# Altium schematic symbol library jlcpcb_2025_04_capacitors_extended_0603.schlib: 3668 symbols (part 7 of 20)
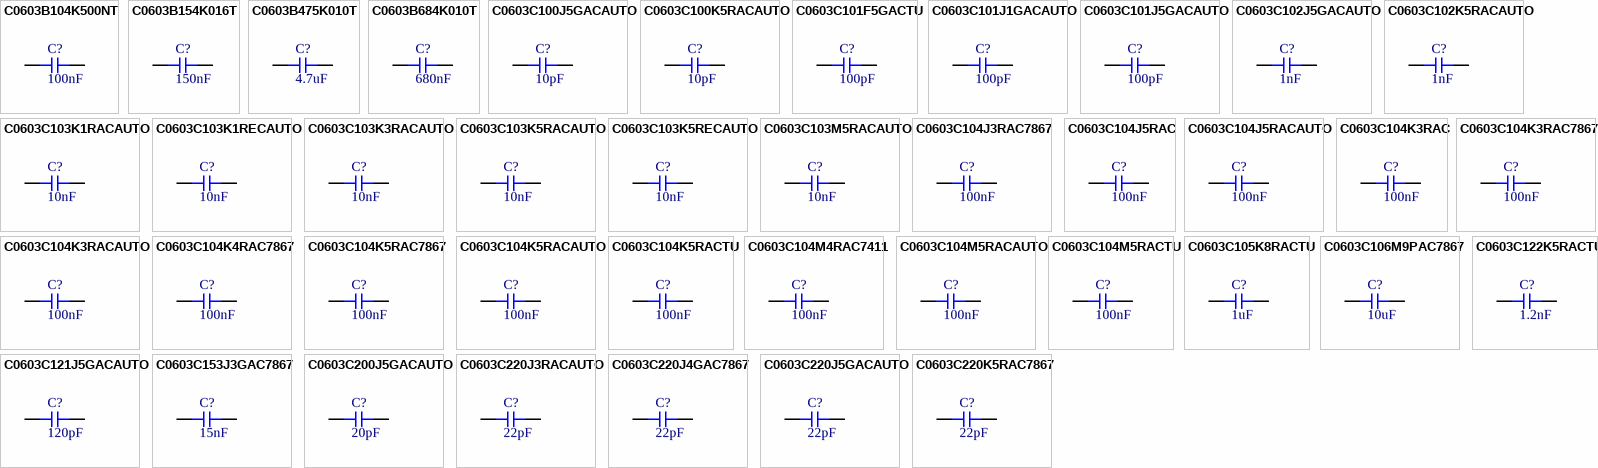
[diagram p97: symbols C0603B104K500NT to C0603C220K5RAC7867]

## C0603C104K3RAC7867
designator C?  Capacitance: 100nF  (hidden comment: *)
Capacitor, Ceramic (MLCC), 100nF, ±10%, 25V, X7R, ±10%, SMD 0603; Manufacturer: KEMET; Manufacturer Part Number: C0603C104K3RAC7867; Package Size: 0603; JLCPCB Basic Part: No; JLCPCB Part Number: C561807; Supplier 1: LCSC; Category: Capacitors - MLCC; Supplier Part Number 1: C561807; Tolerance: ±10%; Voltage Rating: 25V; Temperature Coefficient: X7R; RoHS: Yes; ComponentLink1Description: Datasheet; ComponentLink1URL: https://wmsc.lcsc.com/wmsc/upload/file/pdf/v2/lcsc/2304140030_KEMET-C0603C104K3RAC7867_C561807.pdf; ComponentLink2Description: JLCPCB Part URL; ComponentLink2URL: https://jlcpcb.com/partdetail/C561807; ComponentLink3Description: LCSC Part URL; ComponentLink3URL: https://lcsc.com/product-detail/Multilayer-Ceramic-Capacitors-MLCC---SMD-SMT_KEMET-KEMET-C0603C104K3RAC7867_C561807.html
footprint CAP-0603 (0603 (1608M) Capacitor)
pins: 1, 2

## C0603C104K3RACAUTO
designator C?  Capacitance: 100nF  (hidden comment: *)
Capacitor, Ceramic (MLCC), 100nF, ±10%, 25V, X7R, ±10%, SMD 0603; Manufacturer: KEMET; Manufacturer Part Number: C0603C104K3RACAUTO; Package Size: 0603; JLCPCB Basic Part: No; JLCPCB Part Number: C172738; Supplier 1: LCSC; Category: Capacitors - MLCC; Supplier Part Number 1: C172738; Tolerance: ±10%; Voltage Rating: 25V; Temperature Coefficient: X7R; RoHS: Yes; ComponentLink1Description: Datasheet; ComponentLink1URL: https://wmsc.lcsc.com/wmsc/upload/file/pdf/v2/lcsc/1809291526_KEMET-C0603C104K3RACAUTO_C172738.pdf; ComponentLink2Description: JLCPCB Part URL; ComponentLink2URL: https://jlcpcb.com/partdetail/C172738; ComponentLink3Description: LCSC Part URL; ComponentLink3URL: https://lcsc.com/product-detail/Multilayer-Ceramic-Capacitors-MLCC---SMD-SMT_KEMET-KEMET-C0603C104K3RACAUTO_C172738.html
footprint CAP-0603 (0603 (1608M) Capacitor)
pins: 1, 2

## C0603C104K4RAC7867
designator C?  Capacitance: 100nF  (hidden comment: *)
Capacitor, Ceramic (MLCC), 100nF, ±10%, 16V, X7R, ±10%, SMD 0603; Manufacturer: KEMET; Manufacturer Part Number: C0603C104K4RAC7867; Package Size: 0603; JLCPCB Basic Part: No; JLCPCB Part Number: C141082; Supplier 1: LCSC; Category: Capacitors - MLCC; Supplier Part Number 1: C141082; Tolerance: ±10%; Voltage Rating: 16V; Temperature Coefficient: X7R; RoHS: Yes; ComponentLink1Description: Datasheet; ComponentLink1URL: https://wmsc.lcsc.com/wmsc/upload/file/pdf/v2/lcsc/2304140030_KEMET-C0603C104K4RAC7867_C141082.pdf; ComponentLink2Description: JLCPCB Part URL; ComponentLink2URL: https://jlcpcb.com/partdetail/C141082; ComponentLink3Description: LCSC Part URL; ComponentLink3URL: https://lcsc.com/product-detail/Multilayer-Ceramic-Capacitors-MLCC---SMD-SMT_KEMET-KEMET-C0603C104K4RAC7867_C141082.html
footprint CAP-0603 (0603 (1608M) Capacitor)
pins: 1, 2

## C0603C104K5RAC7867
designator C?  Capacitance: 100nF  (hidden comment: *)
Capacitor, Ceramic (MLCC), 100nF, ±10%, 50V, X7R, ±10%, SMD 0603; Manufacturer: KEMET; Manufacturer Part Number: C0603C104K5RAC7867; Package Size: 0603; JLCPCB Basic Part: No; JLCPCB Part Number: C141084; Supplier 1: LCSC; Category: Capacitors - MLCC; Supplier Part Number 1: C141084; Tolerance: ±10%; Voltage Rating: 50V; Temperature Coefficient: X7R; RoHS: Yes; ComponentLink1Description: Datasheet; ComponentLink1URL: https://wmsc.lcsc.com/wmsc/upload/file/pdf/v2/lcsc/2304140030_KEMET-C0603C104K5RAC7867_C141084.pdf; ComponentLink2Description: JLCPCB Part URL; ComponentLink2URL: https://jlcpcb.com/partdetail/C141084; ComponentLink3Description: LCSC Part URL; ComponentLink3URL: https://lcsc.com/product-detail/Multilayer-Ceramic-Capacitors-MLCC---SMD-SMT_KEMET-KEMET-C0603C104K5RAC7867_C141084.html
footprint CAP-0603 (0603 (1608M) Capacitor)
pins: 1, 2

## C0603C104K5RACAUTO
designator C?  Capacitance: 100nF  (hidden comment: *)
Capacitor, Ceramic (MLCC), 100nF, ±10%, 50V, X7R, ±10%, SMD 0603; Manufacturer: KEMET; Manufacturer Part Number: C0603C104K5RACAUTO; Package Size: 0603; JLCPCB Basic Part: No; JLCPCB Part Number: C129621; Supplier 1: LCSC; Category: Capacitors - MLCC; Supplier Part Number 1: C129621; Tolerance: ±10%; Voltage Rating: 50V; Temperature Coefficient: X7R; RoHS: Yes; ComponentLink1Description: Datasheet; ComponentLink1URL: https://wmsc.lcsc.com/wmsc/upload/file/pdf/v2/lcsc/2304140030_KEMET-C0603C104K5RACAUTO_C129621.pdf; ComponentLink2Description: JLCPCB Part URL; ComponentLink2URL: https://jlcpcb.com/partdetail/C129621; ComponentLink3Description: LCSC Part URL; ComponentLink3URL: https://lcsc.com/product-detail/Multilayer-Ceramic-Capacitors-MLCC---SMD-SMT_KEMET-KEMET-C0603C104K5RACAUTO_C129621.html
footprint CAP-0603 (0603 (1608M) Capacitor)
pins: 1, 2

## C0603C104K5RACTU
designator C?  Capacitance: 100nF  (hidden comment: *)
Capacitor, Ceramic (MLCC), 100nF, ±10%, 50V, X7R, ±10%, SMD 0603; Manufacturer: KEMET; Manufacturer Part Number: C0603C104K5RACTU; Package Size: 0603; JLCPCB Basic Part: No; JLCPCB Part Number: C127833; Supplier 1: LCSC; Category: Capacitors - MLCC; Supplier Part Number 1: C127833; Tolerance: ±10%; Voltage Rating: 50V; Temperature Coefficient: X7R; RoHS: Yes; ComponentLink1Description: Datasheet; ComponentLink1URL: https://wmsc.lcsc.com/wmsc/upload/file/pdf/v2/lcsc/2304140030_KEMET-C0603C104K5RACTU_C127833.pdf; ComponentLink2Description: JLCPCB Part URL; ComponentLink2URL: https://jlcpcb.com/partdetail/C127833; ComponentLink3Description: LCSC Part URL; ComponentLink3URL: https://lcsc.com/product-detail/Multilayer-Ceramic-Capacitors-MLCC---SMD-SMT_KEMET-KEMET-C0603C104K5RACTU_C127833.html
footprint CAP-0603 (0603 (1608M) Capacitor)
pins: 1, 2

## C0603C104M4RAC7411
designator C?  Capacitance: 100nF  (hidden comment: *)
Capacitor, Ceramic (MLCC), 100nF, ±20%, 16V, X7R, ±20%, SMD 0603; Manufacturer: KEMET; Manufacturer Part Number: C0603C104M4RAC7411; Package Size: 0603; JLCPCB Basic Part: No; JLCPCB Part Number: C696360; Supplier 1: LCSC; Category: Capacitors - MLCC; Supplier Part Number 1: C696360; Tolerance: ±20%; Voltage Rating: 16V; Temperature Coefficient: X7R; RoHS: Yes; ComponentLink1Description: Datasheet; ComponentLink1URL: https://wmsc.lcsc.com/wmsc/upload/file/pdf/v2/lcsc/2304140030_KEMET-C0603C104M4RAC7411_C696360.pdf; ComponentLink2Description: JLCPCB Part URL; ComponentLink2URL: https://jlcpcb.com/partdetail/C696360; ComponentLink3Description: LCSC Part URL; ComponentLink3URL: https://lcsc.com/product-detail/Multilayer-Ceramic-Capacitors-MLCC---SMD-SMT_KEMET-KEMET-C0603C104M4RAC7411_C696360.html
footprint CAP-0603 (0603 (1608M) Capacitor)
pins: 1, 2

## C0603C104M5RACAUTO
designator C?  Capacitance: 100nF  (hidden comment: *)
Capacitor, Ceramic (MLCC), 100nF, ±20%, 50V, X7R, ±20%, SMD 0603; Manufacturer: KEMET; Manufacturer Part Number: C0603C104M5RACAUTO; Package Size: 0603; JLCPCB Basic Part: No; JLCPCB Part Number: C1845740; Supplier 1: LCSC; Category: Capacitors - MLCC; Supplier Part Number 1: C1845740; Tolerance: ±20%; Voltage Rating: 50V; Temperature Coefficient: X7R; RoHS: Yes; ComponentLink1Description: Datasheet; ComponentLink1URL: https://wmsc.lcsc.com/wmsc/upload/file/pdf/v2/lcsc/2304140030_KEMET-C0603C104M5RACAUTO_C1845740.pdf; ComponentLink2Description: JLCPCB Part URL; ComponentLink2URL: https://jlcpcb.com/partdetail/C1845740; ComponentLink3Description: LCSC Part URL; ComponentLink3URL: https://lcsc.com/product-detail/Multilayer-Ceramic-Capacitors-MLCC---SMD-SMT_KEMET-KEMET-C0603C104M5RACAUTO_C1845740.html
footprint CAP-0603 (0603 (1608M) Capacitor)
pins: 1, 2

## C0603C104M5RACTU
designator C?  Capacitance: 100nF  (hidden comment: *)
Capacitor, Ceramic (MLCC), 100nF, ±20%, 50V, X7R, ±20%, SMD 0603; Manufacturer: KEMET; Manufacturer Part Number: C0603C104M5RACTU; Package Size: 0603; JLCPCB Basic Part: No; JLCPCB Part Number: C2649536; Supplier 1: LCSC; Category: Capacitors - MLCC; Supplier Part Number 1: C2649536; Tolerance: ±20%; Voltage Rating: 50V; Temperature Coefficient: X7R; RoHS: Yes; ComponentLink1Description: Datasheet; ComponentLink1URL: https://wmsc.lcsc.com/wmsc/upload/file/pdf/v2/lcsc/2304140030_KEMET-C0603C104M5RACTU_C2649536.pdf; ComponentLink2Description: JLCPCB Part URL; ComponentLink2URL: https://jlcpcb.com/partdetail/C2649536; ComponentLink3Description: LCSC Part URL; ComponentLink3URL: https://lcsc.com/product-detail/Multilayer-Ceramic-Capacitors-MLCC---SMD-SMT_KEMET-KEMET-C0603C104M5RACTU_C2649536.html
footprint CAP-0603 (0603 (1608M) Capacitor)
pins: 1, 2

## C0603C105K8RACTU
designator C?  Capacitance: 1uF  (hidden comment: *)
Capacitor, Ceramic (MLCC), 1uF, ±10%, 10V, X7R, ±10%, SMD 0603; Manufacturer: KEMET; Manufacturer Part Number: C0603C105K8RACTU; Package Size: 0603; JLCPCB Basic Part: No; JLCPCB Part Number: C2168630; Supplier 1: LCSC; Category: Capacitors - MLCC; Supplier Part Number 1: C2168630; Tolerance: ±10%; Voltage Rating: 10V; Temperature Coefficient: X7R; RoHS: Yes; ComponentLink1Description: Datasheet; ComponentLink1URL: https://wmsc.lcsc.com/wmsc/upload/file/pdf/v2/lcsc/2304140030_KEMET-C0603C105K8RACTU_C2168630.pdf; ComponentLink2Description: JLCPCB Part URL; ComponentLink2URL: https://jlcpcb.com/partdetail/C2168630; ComponentLink3Description: LCSC Part URL; ComponentLink3URL: https://lcsc.com/product-detail/Multilayer-Ceramic-Capacitors-MLCC---SMD-SMT_KEMET-KEMET-C0603C105K8RACTU_C2168630.html
footprint CAP-0603 (0603 (1608M) Capacitor)
pins: 1, 2

## C0603C106M9PAC7867
designator C?  Capacitance: 10uF  (hidden comment: *)
Capacitor, Ceramic (MLCC), 10uF, ±20%, 6.3V, X5R, ±20%, SMD 0603; Manufacturer: KEMET; Manufacturer Part Number: C0603C106M9PAC7867; Package Size: 0603; JLCPCB Basic Part: No; JLCPCB Part Number: C599662; Supplier 1: LCSC; Category: Capacitors - MLCC; Supplier Part Number 1: C599662; Tolerance: ±20%; Voltage Rating: 6.3V; Temperature Coefficient: X5R; RoHS: Yes; ComponentLink1Description: Datasheet; ComponentLink1URL: https://wmsc.lcsc.com/wmsc/upload/file/pdf/v2/lcsc/2006181135_KEMET-C0603C106M9PAC7867_C599662.pdf; ComponentLink2Description: JLCPCB Part URL; ComponentLink2URL: https://jlcpcb.com/partdetail/C599662; ComponentLink3Description: LCSC Part URL; ComponentLink3URL: https://lcsc.com/product-detail/Multilayer-Ceramic-Capacitors-MLCC---SMD-SMT_KEMET-KEMET-C0603C106M9PAC7867_C599662.html
footprint CAP-0603 (0603 (1608M) Capacitor)
pins: 1, 2

## C0603C121J5GACAUTO
designator C?  Capacitance: 120pF  (hidden comment: *)
Capacitor, Ceramic (MLCC), 120pF, ±5%, 50V, C0G, ±5%, SMD 0603; Manufacturer: KEMET; Manufacturer Part Number: C0603C121J5GACAUTO; Package Size: 0603; JLCPCB Basic Part: No; JLCPCB Part Number: C599667; Supplier 1: LCSC; Category: Capacitors - MLCC; Supplier Part Number 1: C599667; Tolerance: ±5%; Voltage Rating: 50V; Temperature Coefficient: C0G; RoHS: Yes; ComponentLink1Description: Datasheet; ComponentLink1URL: https://wmsc.lcsc.com/wmsc/upload/file/pdf/v2/lcsc/2006181135_KEMET-C0603C121J5GACAUTO_C599667.pdf; ComponentLink2Description: JLCPCB Part URL; ComponentLink2URL: https://jlcpcb.com/partdetail/C599667; ComponentLink3Description: LCSC Part URL; ComponentLink3URL: https://lcsc.com/product-detail/Multilayer-Ceramic-Capacitors-MLCC---SMD-SMT_KEMET-KEMET-C0603C121J5GACAUTO_C599667.html
footprint CAP-0603 (0603 (1608M) Capacitor)
pins: 1, 2

## C0603C122K5RACTU
designator C?  Capacitance: 1.2nF  (hidden comment: *)
Capacitor, Ceramic (MLCC), 1.2nF, ±10%, 50V, X7R, ±10%, SMD 0603; Manufacturer: KEMET; Manufacturer Part Number: C0603C122K5RACTU; Package Size: 0603; JLCPCB Basic Part: No; JLCPCB Part Number: C2168436; Supplier 1: LCSC; Category: Capacitors - MLCC; Supplier Part Number 1: C2168436; Tolerance: ±10%; Voltage Rating: 50V; Temperature Coefficient: X7R; RoHS: Yes; ComponentLink1Description: Datasheet; ComponentLink1URL: https://wmsc.lcsc.com/wmsc/upload/file/pdf/v2/lcsc/2304140030_KEMET-C0603C122K5RACTU_C2168436.pdf; ComponentLink2Description: JLCPCB Part URL; ComponentLink2URL: https://jlcpcb.com/partdetail/C2168436; ComponentLink3Description: LCSC Part URL; ComponentLink3URL: https://lcsc.com/product-detail/Multilayer-Ceramic-Capacitors-MLCC---SMD-SMT_KEMET-KEMET-C0603C122K5RACTU_C2168436.html
footprint CAP-0603 (0603 (1608M) Capacitor)
pins: 1, 2

## C0603C153J3GAC7867
designator C?  Capacitance: 15nF  (hidden comment: *)
Capacitor, Ceramic (MLCC), 15nF, ±5%, 25V, C0G, ±5%, SMD 0603; Manufacturer: KEMET; Manufacturer Part Number: C0603C153J3GAC7867; Package Size: 0603; JLCPCB Basic Part: No; JLCPCB Part Number: C696363; Supplier 1: LCSC; Category: Capacitors - MLCC; Supplier Part Number 1: C696363; Tolerance: ±5%; Voltage Rating: 25V; Temperature Coefficient: C0G; RoHS: Yes; ComponentLink1Description: Datasheet; ComponentLink1URL: https://wmsc.lcsc.com/wmsc/upload/file/pdf/v2/lcsc/2304140030_KEMET-C0603C153J3GAC7867_C696363.pdf; ComponentLink2Description: JLCPCB Part URL; ComponentLink2URL: https://jlcpcb.com/partdetail/C696363; ComponentLink3Description: LCSC Part URL; ComponentLink3URL: https://lcsc.com/product-detail/Multilayer-Ceramic-Capacitors-MLCC---SMD-SMT_KEMET-KEMET-C0603C153J3GAC7867_C696363.html
footprint CAP-0603 (0603 (1608M) Capacitor)
pins: 1, 2

## C0603C200J5GACAUTO
designator C?  Capacitance: 20pF  (hidden comment: *)
Capacitor, Ceramic (MLCC), 20pF, ±5%, 50V, C0G, ±5%, SMD 0603; Manufacturer: KEMET; Manufacturer Part Number: C0603C200J5GACAUTO; Package Size: 0603; JLCPCB Basic Part: No; JLCPCB Part Number: C129624; Supplier 1: LCSC; Category: Capacitors - MLCC; Supplier Part Number 1: C129624; Tolerance: ±5%; Voltage Rating: 50V; Temperature Coefficient: C0G; RoHS: Yes; ComponentLink1Description: Datasheet; ComponentLink1URL: https://wmsc.lcsc.com/wmsc/upload/file/pdf/v2/lcsc/2304140030_KEMET-C0603C200J5GACAUTO_C129624.pdf; ComponentLink2Description: JLCPCB Part URL; ComponentLink2URL: https://jlcpcb.com/partdetail/C129624; ComponentLink3Description: LCSC Part URL; ComponentLink3URL: https://lcsc.com/product-detail/Multilayer-Ceramic-Capacitors-MLCC---SMD-SMT_KEMET-KEMET-C0603C200J5GACAUTO_C129624.html
footprint CAP-0603 (0603 (1608M) Capacitor)
pins: 1, 2

## C0603C220J3RACAUTO
designator C?  Capacitance: 22pF  (hidden comment: *)
Capacitor, Ceramic (MLCC), 22pF, ±5%, 25V, X7R, ±5%, SMD 0603; Manufacturer: KEMET; Manufacturer Part Number: C0603C220J3RACAUTO; Package Size: 0603; JLCPCB Basic Part: No; JLCPCB Part Number: C129626; Supplier 1: LCSC; Category: Capacitors - MLCC; Supplier Part Number 1: C129626; Tolerance: ±5%; Voltage Rating: 25V; Temperature Coefficient: X7R; RoHS: Yes; ComponentLink1Description: Datasheet; ComponentLink1URL: https://wmsc.lcsc.com/wmsc/upload/file/pdf/v2/lcsc/2304140030_KEMET-C0603C220J3RACAUTO_C129626.pdf; ComponentLink2Description: JLCPCB Part URL; ComponentLink2URL: https://jlcpcb.com/partdetail/C129626; ComponentLink3Description: LCSC Part URL; ComponentLink3URL: https://lcsc.com/product-detail/Multilayer-Ceramic-Capacitors-MLCC---SMD-SMT_KEMET-KEMET-C0603C220J3RACAUTO_C129626.html
footprint CAP-0603 (0603 (1608M) Capacitor)
pins: 1, 2

## C0603C220J4GAC7867
designator C?  Capacitance: 22pF  (hidden comment: *)
Capacitor, Ceramic (MLCC), 22pF, ±5%, 16V, C0G, ±5%, SMD 0603; Manufacturer: KEMET; Manufacturer Part Number: C0603C220J4GAC7867; Package Size: 0603; JLCPCB Basic Part: No; JLCPCB Part Number: C561800; Supplier 1: LCSC; Category: Capacitors - MLCC; Supplier Part Number 1: C561800; Tolerance: ±5%; Voltage Rating: 16V; Temperature Coefficient: C0G; RoHS: Yes; ComponentLink1Description: Datasheet; ComponentLink1URL: https://wmsc.lcsc.com/wmsc/upload/file/pdf/v2/lcsc/2006181109_KEMET-C0603C220J4GAC7867_C561800.pdf; ComponentLink2Description: JLCPCB Part URL; ComponentLink2URL: https://jlcpcb.com/partdetail/C561800; ComponentLink3Description: LCSC Part URL; ComponentLink3URL: https://lcsc.com/product-detail/Multilayer-Ceramic-Capacitors-MLCC---SMD-SMT_KEMET-KEMET-C0603C220J4GAC7867_C561800.html
footprint CAP-0603 (0603 (1608M) Capacitor)
pins: 1, 2

## C0603C220J5GACAUTO
designator C?  Capacitance: 22pF  (hidden comment: *)
Capacitor, Ceramic (MLCC), 22pF, ±5%, 50V, C0G, ±5%, SMD 0603; Manufacturer: KEMET; Manufacturer Part Number: C0603C220J5GACAUTO; Package Size: 0603; JLCPCB Basic Part: No; JLCPCB Part Number: C599692; Supplier 1: LCSC; Category: Capacitors - MLCC; Supplier Part Number 1: C599692; Tolerance: ±5%; Voltage Rating: 50V; Temperature Coefficient: C0G; RoHS: Yes; ComponentLink1Description: Datasheet; ComponentLink1URL: https://wmsc.lcsc.com/wmsc/upload/file/pdf/v2/lcsc/2006181136_KEMET-C0603C220J5GACAUTO_C599692.pdf; ComponentLink2Description: JLCPCB Part URL; ComponentLink2URL: https://jlcpcb.com/partdetail/C599692; ComponentLink3Description: LCSC Part URL; ComponentLink3URL: https://lcsc.com/product-detail/Multilayer-Ceramic-Capacitors-MLCC---SMD-SMT_KEMET-KEMET-C0603C220J5GACAUTO_C599692.html
footprint CAP-0603 (0603 (1608M) Capacitor)
pins: 1, 2

## C0603C220K5RAC7867
designator C?  Capacitance: 22pF  (hidden comment: *)
Capacitor, Ceramic (MLCC), 22pF, ±10%, 50V, X7R, ±10%, SMD 0603; Manufacturer: KEMET; Manufacturer Part Number: C0603C220K5RAC7867; Package Size: 0603; JLCPCB Basic Part: No; JLCPCB Part Number: C561821; Supplier 1: LCSC; Category: Capacitors - MLCC; Supplier Part Number 1: C561821; Tolerance: ±10%; Voltage Rating: 50V; Temperature Coefficient: X7R; RoHS: Yes; ComponentLink1Description: Datasheet; ComponentLink1URL: https://wmsc.lcsc.com/wmsc/upload/file/pdf/v2/lcsc/2304140030_KEMET-C0603C220K5RAC7867_C561821.pdf; ComponentLink2Description: JLCPCB Part URL; ComponentLink2URL: https://jlcpcb.com/partdetail/C561821; ComponentLink3Description: LCSC Part URL; ComponentLink3URL: https://lcsc.com/product-detail/Multilayer-Ceramic-Capacitors-MLCC---SMD-SMT_KEMET-KEMET-C0603C220K5RAC7867_C561821.html
footprint CAP-0603 (0603 (1608M) Capacitor)
pins: 1, 2

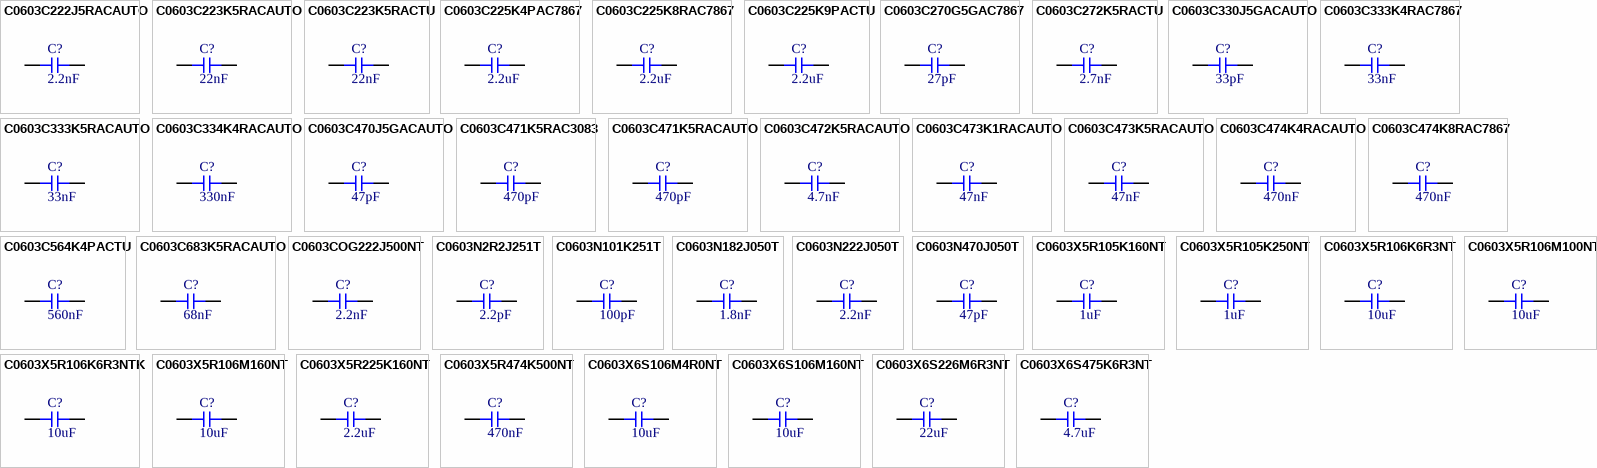
[diagram p28: symbols C0603C222J5RACAUTO to C0603X6S475K6R3NT]

## C0603C222J5RACAUTO
designator C?  Capacitance: 2.2nF  (hidden comment: *)
Capacitor, Ceramic (MLCC), 2.2nF, ±5%, 50V, X7R, ±5%, SMD 0603; Manufacturer: KEMET; Manufacturer Part Number: C0603C222J5RACAUTO; Package Size: 0603; JLCPCB Basic Part: No; JLCPCB Part Number: C599701; Supplier 1: LCSC; Category: Capacitors - MLCC; Supplier Part Number 1: C599701; Tolerance: ±5%; Voltage Rating: 50V; Temperature Coefficient: X7R; RoHS: Yes; ComponentLink1Description: Datasheet; ComponentLink1URL: https://wmsc.lcsc.com/wmsc/upload/file/pdf/v2/lcsc/2304140030_KEMET-C0603C222J5RACAUTO_C599701.pdf; ComponentLink2Description: JLCPCB Part URL; ComponentLink2URL: https://jlcpcb.com/partdetail/C599701; ComponentLink3Description: LCSC Part URL; ComponentLink3URL: https://lcsc.com/product-detail/Multilayer-Ceramic-Capacitors-MLCC---SMD-SMT_KEMET-KEMET-C0603C222J5RACAUTO_C599701.html
footprint CAP-0603 (0603 (1608M) Capacitor)
pins: 1, 2

## C0603C223K5RACAUTO
designator C?  Capacitance: 22nF  (hidden comment: *)
Capacitor, Ceramic (MLCC), 22nF, ±10%, 50V, X7R, ±10%, SMD 0603; Manufacturer: KEMET; Manufacturer Part Number: C0603C223K5RACAUTO; Package Size: 0603; JLCPCB Basic Part: No; JLCPCB Part Number: C561824; Supplier 1: LCSC; Category: Capacitors - MLCC; Supplier Part Number 1: C561824; Tolerance: ±10%; Voltage Rating: 50V; Temperature Coefficient: X7R; RoHS: Yes; ComponentLink1Description: Datasheet; ComponentLink1URL: https://wmsc.lcsc.com/wmsc/upload/file/pdf/v2/lcsc/2304140030_KEMET-C0603C223K5RACAUTO_C561824.pdf; ComponentLink2Description: JLCPCB Part URL; ComponentLink2URL: https://jlcpcb.com/partdetail/C561824; ComponentLink3Description: LCSC Part URL; ComponentLink3URL: https://lcsc.com/product-detail/Multilayer-Ceramic-Capacitors-MLCC---SMD-SMT_KEMET-KEMET-C0603C223K5RACAUTO_C561824.html
footprint CAP-0603 (0603 (1608M) Capacitor)
pins: 1, 2

## C0603C223K5RACTU
designator C?  Capacitance: 22nF  (hidden comment: *)
Capacitor, Ceramic (MLCC), 22nF, ±10%, 50V, X7R, ±10%, SMD 0603; Manufacturer: KEMET; Manufacturer Part Number: C0603C223K5RACTU; Package Size: 0603; JLCPCB Basic Part: No; JLCPCB Part Number: C2167136; Supplier 1: LCSC; Category: Capacitors - MLCC; Supplier Part Number 1: C2167136; Tolerance: ±10%; Voltage Rating: 50V; Temperature Coefficient: X7R; RoHS: Yes; ComponentLink1Description: Datasheet; ComponentLink1URL: https://wmsc.lcsc.com/wmsc/upload/file/pdf/v2/lcsc/2304140030_KEMET-C0603C223K5RACTU_C2167136.pdf; ComponentLink2Description: JLCPCB Part URL; ComponentLink2URL: https://jlcpcb.com/partdetail/C2167136; ComponentLink3Description: LCSC Part URL; ComponentLink3URL: https://lcsc.com/product-detail/Multilayer-Ceramic-Capacitors-MLCC---SMD-SMT_KEMET-KEMET-C0603C223K5RACTU_C2167136.html
footprint CAP-0603 (0603 (1608M) Capacitor)
pins: 1, 2

## C0603C225K4PAC7867
designator C?  Capacitance: 2.2uF  (hidden comment: *)
Capacitor, Ceramic (MLCC), 2.2uF, ±10%, 16V, X5R, ±10%, SMD 0603; Manufacturer: KEMET; Manufacturer Part Number: C0603C225K4PAC7867; Package Size: 0603; JLCPCB Basic Part: No; JLCPCB Part Number: C452748; Supplier 1: LCSC; Category: Capacitors - MLCC; Supplier Part Number 1: C452748; Tolerance: ±10%; Voltage Rating: 16V; Temperature Coefficient: X5R; RoHS: Yes; ComponentLink1Description: Datasheet; ComponentLink1URL: https://wmsc.lcsc.com/wmsc/upload/file/pdf/v2/lcsc/2304140030_KEMET-C0603C225K4PAC7867_C452748.pdf; ComponentLink2Description: JLCPCB Part URL; ComponentLink2URL: https://jlcpcb.com/partdetail/C452748; ComponentLink3Description: LCSC Part URL; ComponentLink3URL: https://lcsc.com/product-detail/Multilayer-Ceramic-Capacitors-MLCC---SMD-SMT_KEMET-KEMET-C0603C225K4PAC7867_C452748.html
footprint CAP-0603 (0603 (1608M) Capacitor)
pins: 1, 2

## C0603C225K8RAC7867
designator C?  Capacitance: 2.2uF  (hidden comment: *)
Capacitor, Ceramic (MLCC), 2.2uF, ±10%, 10V, X7R, ±10%, SMD 0603; Manufacturer: KEMET; Manufacturer Part Number: C0603C225K8RAC7867; Package Size: 0603; JLCPCB Basic Part: No; JLCPCB Part Number: C599715; Supplier 1: LCSC; Category: Capacitors - MLCC; Supplier Part Number 1: C599715; Tolerance: ±10%; Voltage Rating: 10V; Temperature Coefficient: X7R; RoHS: Yes; ComponentLink1Description: Datasheet; ComponentLink1URL: https://wmsc.lcsc.com/wmsc/upload/file/pdf/v2/lcsc/2304140030_KEMET-C0603C225K8RAC7867_C599715.pdf; ComponentLink2Description: JLCPCB Part URL; ComponentLink2URL: https://jlcpcb.com/partdetail/C599715; ComponentLink3Description: LCSC Part URL; ComponentLink3URL: https://lcsc.com/product-detail/Multilayer-Ceramic-Capacitors-MLCC---SMD-SMT_KEMET-KEMET-C0603C225K8RAC7867_C599715.html
footprint CAP-0603 (0603 (1608M) Capacitor)
pins: 1, 2

## C0603C225K9PACTU
designator C?  Capacitance: 2.2uF  (hidden comment: *)
Capacitor, Ceramic (MLCC), 2.2uF, ±10%, 6.3V, X5R, ±10%, SMD 0603; Manufacturer: KEMET; Manufacturer Part Number: C0603C225K9PACTU; Package Size: 0603; JLCPCB Basic Part: No; JLCPCB Part Number: C452749; Supplier 1: LCSC; Category: Capacitors - MLCC; Supplier Part Number 1: C452749; Tolerance: ±10%; Voltage Rating: 6.3V; Temperature Coefficient: X5R; RoHS: Yes; ComponentLink1Description: Datasheet; ComponentLink1URL: https://wmsc.lcsc.com/wmsc/upload/file/pdf/v2/lcsc/2304140030_KEMET-C0603C225K9PACTU_C452749.pdf; ComponentLink2Description: JLCPCB Part URL; ComponentLink2URL: https://jlcpcb.com/partdetail/C452749; ComponentLink3Description: LCSC Part URL; ComponentLink3URL: https://lcsc.com/product-detail/Multilayer-Ceramic-Capacitors-MLCC---SMD-SMT_KEMET-KEMET-C0603C225K9PACTU_C452749.html
footprint CAP-0603 (0603 (1608M) Capacitor)
pins: 1, 2

## C0603C270G5GAC7867
designator C?  Capacitance: 27pF  (hidden comment: *)
Capacitor, Ceramic (MLCC), 27pF, ±2%, 50V, C0G, ±2%, SMD 0603; Manufacturer: KEMET; Manufacturer Part Number: C0603C270G5GAC7867; Package Size: 0603; JLCPCB Basic Part: No; JLCPCB Part Number: C140963; Supplier 1: LCSC; Category: Capacitors - MLCC; Supplier Part Number 1: C140963; Tolerance: ±2%; Voltage Rating: 50V; Temperature Coefficient: C0G; RoHS: Yes; ComponentLink1Description: Datasheet; ComponentLink1URL: https://wmsc.lcsc.com/wmsc/upload/file/pdf/v2/lcsc/2304140030_KEMET-C0603C270G5GAC7867_C140963.pdf; ComponentLink2Description: JLCPCB Part URL; ComponentLink2URL: https://jlcpcb.com/partdetail/C140963; ComponentLink3Description: LCSC Part URL; ComponentLink3URL: https://lcsc.com/product-detail/Multilayer-Ceramic-Capacitors-MLCC---SMD-SMT_KEMET-KEMET-C0603C270G5GAC7867_C140963.html
footprint CAP-0603 (0603 (1608M) Capacitor)
pins: 1, 2

## C0603C272K5RACTU
designator C?  Capacitance: 2.7nF  (hidden comment: *)
Capacitor, Ceramic (MLCC), 2.7nF, ±10%, 50V, X7R, ±10%, SMD 0603; Manufacturer: KEMET; Manufacturer Part Number: C0603C272K5RACTU; Package Size: 0603; JLCPCB Basic Part: No; JLCPCB Part Number: C122709; Supplier 1: LCSC; Category: Capacitors - MLCC; Supplier Part Number 1: C122709; Tolerance: ±10%; Voltage Rating: 50V; Temperature Coefficient: X7R; RoHS: Yes; ComponentLink1Description: Datasheet; ComponentLink2Description: JLCPCB Part URL; ComponentLink2URL: https://jlcpcb.com/partdetail/C122709; ComponentLink3Description: LCSC Part URL; ComponentLink3URL: https://lcsc.com/product-detail/Multilayer-Ceramic-Capacitors-MLCC---SMD-SMT_KEMET-KEMET-C0603C272K5RACTU_C122709.html
footprint CAP-0603 (0603 (1608M) Capacitor)
pins: 1, 2

## C0603C330J5GACAUTO
designator C?  Capacitance: 33pF  (hidden comment: *)
Capacitor, Ceramic (MLCC), 33pF, ±5%, 50V, C0G, ±5%, SMD 0603; Manufacturer: KEMET; Manufacturer Part Number: C0603C330J5GACAUTO; Package Size: 0603; JLCPCB Basic Part: No; JLCPCB Part Number: C3888087; Supplier 1: LCSC; Category: Capacitors - MLCC; Supplier Part Number 1: C3888087; Tolerance: ±5%; Voltage Rating: 50V; Temperature Coefficient: C0G; RoHS: Yes; ComponentLink1Description: Datasheet; ComponentLink1URL: https://wmsc.lcsc.com/wmsc/upload/file/pdf/v2/lcsc/2401181722_KEMET-C0603C330J5GACAUTO_C3888087.pdf; ComponentLink2Description: JLCPCB Part URL; ComponentLink2URL: https://jlcpcb.com/partdetail/C3888087; ComponentLink3Description: LCSC Part URL; ComponentLink3URL: https://lcsc.com/product-detail/Multilayer-Ceramic-Capacitors-MLCC---SMD-SMT_KEMET-KEMET-C0603C330J5GACAUTO_C3888087.html
footprint CAP-0603 (0603 (1608M) Capacitor)
pins: 1, 2

## C0603C333K4RAC7867
designator C?  Capacitance: 33nF  (hidden comment: *)
Capacitor, Ceramic (MLCC), 33nF, ±10%, 16V, X7R, ±10%, SMD 0603; Manufacturer: KEMET; Manufacturer Part Number: C0603C333K4RAC7867; Package Size: 0603; JLCPCB Basic Part: No; JLCPCB Part Number: C599735; Supplier 1: LCSC; Category: Capacitors - MLCC; Supplier Part Number 1: C599735; Tolerance: ±10%; Voltage Rating: 16V; Temperature Coefficient: X7R; RoHS: Yes; ComponentLink1Description: Datasheet; ComponentLink1URL: https://wmsc.lcsc.com/wmsc/upload/file/pdf/v2/lcsc/2304140030_KEMET-C0603C333K4RAC7867_C599735.pdf; ComponentLink2Description: JLCPCB Part URL; ComponentLink2URL: https://jlcpcb.com/partdetail/C599735; ComponentLink3Description: LCSC Part URL; ComponentLink3URL: https://lcsc.com/product-detail/Multilayer-Ceramic-Capacitors-MLCC---SMD-SMT_KEMET-KEMET-C0603C333K4RAC7867_C599735.html
footprint CAP-0603 (0603 (1608M) Capacitor)
pins: 1, 2

## C0603C333K5RACAUTO
designator C?  Capacitance: 33nF  (hidden comment: *)
Capacitor, Ceramic (MLCC), 33nF, ±10%, 50V, X7R, ±10%, SMD 0603; Manufacturer: KEMET; Manufacturer Part Number: C0603C333K5RACAUTO; Package Size: 0603; JLCPCB Basic Part: No; JLCPCB Part Number: C141101; Supplier 1: LCSC; Category: Capacitors - MLCC; Supplier Part Number 1: C141101; Tolerance: ±10%; Voltage Rating: 50V; Temperature Coefficient: X7R; RoHS: Yes; ComponentLink1Description: Datasheet; ComponentLink1URL: https://wmsc.lcsc.com/wmsc/upload/file/pdf/v2/lcsc/2304140030_KEMET-C0603C333K5RACAUTO_C141101.pdf; ComponentLink2Description: JLCPCB Part URL; ComponentLink2URL: https://jlcpcb.com/partdetail/C141101; ComponentLink3Description: LCSC Part URL; ComponentLink3URL: https://lcsc.com/product-detail/Multilayer-Ceramic-Capacitors-MLCC---SMD-SMT_KEMET-KEMET-C0603C333K5RACAUTO_C141101.html
footprint CAP-0603 (0603 (1608M) Capacitor)
pins: 1, 2

## C0603C334K4RACAUTO
designator C?  Capacitance: 330nF  (hidden comment: *)
Capacitor, Ceramic (MLCC), 330nF, ±10%, 16V, X7R, ±10%, SMD 0603; Manufacturer: KEMET; Manufacturer Part Number: C0603C334K4RACAUTO; Package Size: 0603; JLCPCB Basic Part: No; JLCPCB Part Number: C599738; Supplier 1: LCSC; Category: Capacitors - MLCC; Supplier Part Number 1: C599738; Tolerance: ±10%; Voltage Rating: 16V; Temperature Coefficient: X7R; RoHS: Yes; ComponentLink1Description: Datasheet; ComponentLink1URL: https://wmsc.lcsc.com/wmsc/upload/file/pdf/v2/lcsc/2304140030_KEMET-C0603C334K4RACAUTO_C599738.pdf; ComponentLink2Description: JLCPCB Part URL; ComponentLink2URL: https://jlcpcb.com/partdetail/C599738; ComponentLink3Description: LCSC Part URL; ComponentLink3URL: https://lcsc.com/product-detail/Multilayer-Ceramic-Capacitors-MLCC---SMD-SMT_KEMET-KEMET-C0603C334K4RACAUTO_C599738.html
footprint CAP-0603 (0603 (1608M) Capacitor)
pins: 1, 2

## C0603C470J5GACAUTO
designator C?  Capacitance: 47pF  (hidden comment: *)
Capacitor, Ceramic (MLCC), 47pF, ±5%, 50V, C0G, ±5%, SMD 0603; Manufacturer: KEMET; Manufacturer Part Number: C0603C470J5GACAUTO; Package Size: 0603; JLCPCB Basic Part: No; JLCPCB Part Number: C599750; Supplier 1: LCSC; Category: Capacitors - MLCC; Supplier Part Number 1: C599750; Tolerance: ±5%; Voltage Rating: 50V; Temperature Coefficient: C0G; RoHS: Yes; ComponentLink1Description: Datasheet; ComponentLink1URL: https://wmsc.lcsc.com/wmsc/upload/file/pdf/v2/lcsc/2006181209_KEMET-C0603C470J5GACAUTO_C599750.pdf; ComponentLink2Description: JLCPCB Part URL; ComponentLink2URL: https://jlcpcb.com/partdetail/C599750; ComponentLink3Description: LCSC Part URL; ComponentLink3URL: https://lcsc.com/product-detail/Multilayer-Ceramic-Capacitors-MLCC---SMD-SMT_KEMET-KEMET-C0603C470J5GACAUTO_C599750.html
footprint CAP-0603 (0603 (1608M) Capacitor)
pins: 1, 2

## C0603C471K5RAC3083
designator C?  Capacitance: 470pF  (hidden comment: *)
Capacitor, Ceramic (MLCC), 470pF, ±10%, 50V, X7R, ±10%, SMD 0603; Manufacturer: KEMET; Manufacturer Part Number: C0603C471K5RAC3083; Package Size: 0603; JLCPCB Basic Part: No; JLCPCB Part Number: C141103; Supplier 1: LCSC; Category: Capacitors - MLCC; Supplier Part Number 1: C141103; Tolerance: ±10%; Voltage Rating: 50V; Temperature Coefficient: X7R; RoHS: Yes; ComponentLink1Description: Datasheet; ComponentLink1URL: https://wmsc.lcsc.com/wmsc/upload/file/pdf/v2/lcsc/2304140030_KEMET-C0603C471K5RAC3083_C141103.pdf; ComponentLink2Description: JLCPCB Part URL; ComponentLink2URL: https://jlcpcb.com/partdetail/C141103; ComponentLink3Description: LCSC Part URL; ComponentLink3URL: https://lcsc.com/product-detail/Multilayer-Ceramic-Capacitors-MLCC---SMD-SMT_KEMET-KEMET-C0603C471K5RAC3083_C141103.html
footprint CAP-0603 (0603 (1608M) Capacitor)
pins: 1, 2

## C0603C471K5RACAUTO
designator C?  Capacitance: 470pF  (hidden comment: *)
Capacitor, Ceramic (MLCC), 470pF, ±10%, 50V, X7R, ±10%, SMD 0603; Manufacturer: KEMET; Manufacturer Part Number: C0603C471K5RACAUTO; Package Size: 0603; JLCPCB Basic Part: No; JLCPCB Part Number: C129628; Supplier 1: LCSC; Category: Capacitors - MLCC; Supplier Part Number 1: C129628; Tolerance: ±10%; Voltage Rating: 50V; Temperature Coefficient: X7R; RoHS: Yes; ComponentLink1Description: Datasheet; ComponentLink1URL: https://wmsc.lcsc.com/wmsc/upload/file/pdf/v2/lcsc/2304140030_KEMET-C0603C471K5RACAUTO_C129628.pdf; ComponentLink2Description: JLCPCB Part URL; ComponentLink2URL: https://jlcpcb.com/partdetail/C129628; ComponentLink3Description: LCSC Part URL; ComponentLink3URL: https://lcsc.com/product-detail/Multilayer-Ceramic-Capacitors-MLCC---SMD-SMT_KEMET-KEMET-C0603C471K5RACAUTO_C129628.html
footprint CAP-0603 (0603 (1608M) Capacitor)
pins: 1, 2

## C0603C472K5RACAUTO
designator C?  Capacitance: 4.7nF  (hidden comment: *)
Capacitor, Ceramic (MLCC), 4.7nF, ±10%, 50V, X7R, ±10%, SMD 0603; Manufacturer: KEMET; Manufacturer Part Number: C0603C472K5RACAUTO; Package Size: 0603; JLCPCB Basic Part: No; JLCPCB Part Number: C141106; Supplier 1: LCSC; Category: Capacitors - MLCC; Supplier Part Number 1: C141106; Tolerance: ±10%; Voltage Rating: 50V; Temperature Coefficient: X7R; RoHS: Yes; ComponentLink1Description: Datasheet; ComponentLink1URL: https://wmsc.lcsc.com/wmsc/upload/file/pdf/v2/lcsc/2304140030_KEMET-C0603C472K5RACAUTO_C141106.pdf; ComponentLink2Description: JLCPCB Part URL; ComponentLink2URL: https://jlcpcb.com/partdetail/C141106; ComponentLink3Description: LCSC Part URL; ComponentLink3URL: https://lcsc.com/product-detail/Multilayer-Ceramic-Capacitors-MLCC---SMD-SMT_KEMET-KEMET-C0603C472K5RACAUTO_C141106.html
footprint CAP-0603 (0603 (1608M) Capacitor)
pins: 1, 2

## C0603C473K1RACAUTO
designator C?  Capacitance: 47nF  (hidden comment: *)
Capacitor, Ceramic (MLCC), 47nF, ±10%, 100V, X7R, ±10%, SMD 0603; Manufacturer: KEMET; Manufacturer Part Number: C0603C473K1RACAUTO; Package Size: 0603; JLCPCB Basic Part: No; JLCPCB Part Number: C561782; Supplier 1: LCSC; Category: Capacitors - MLCC; Supplier Part Number 1: C561782; Tolerance: ±10%; Voltage Rating: 100V; Temperature Coefficient: X7R; RoHS: Yes; ComponentLink1Description: Datasheet; ComponentLink1URL: https://wmsc.lcsc.com/wmsc/upload/file/pdf/v2/lcsc/2304140030_KEMET-C0603C473K1RACAUTO_C561782.pdf; ComponentLink2Description: JLCPCB Part URL; ComponentLink2URL: https://jlcpcb.com/partdetail/C561782; ComponentLink3Description: LCSC Part URL; ComponentLink3URL: https://lcsc.com/product-detail/Multilayer-Ceramic-Capacitors-MLCC---SMD-SMT_KEMET-KEMET-C0603C473K1RACAUTO_C561782.html
footprint CAP-0603 (0603 (1608M) Capacitor)
pins: 1, 2

## C0603C473K5RACAUTO
designator C?  Capacitance: 47nF  (hidden comment: *)
Capacitor, Ceramic (MLCC), 47nF, ±10%, 50V, X7R, ±10%, SMD 0603; Manufacturer: KEMET; Manufacturer Part Number: C0603C473K5RACAUTO; Package Size: 0603; JLCPCB Basic Part: No; JLCPCB Part Number: C129629; Supplier 1: LCSC; Category: Capacitors - MLCC; Supplier Part Number 1: C129629; Tolerance: ±10%; Voltage Rating: 50V; Temperature Coefficient: X7R; RoHS: Yes; ComponentLink1Description: Datasheet; ComponentLink1URL: https://wmsc.lcsc.com/wmsc/upload/file/pdf/v2/lcsc/2304140030_KEMET-C0603C473K5RACAUTO_C129629.pdf; ComponentLink2Description: JLCPCB Part URL; ComponentLink2URL: https://jlcpcb.com/partdetail/C129629; ComponentLink3Description: LCSC Part URL; ComponentLink3URL: https://lcsc.com/product-detail/Multilayer-Ceramic-Capacitors-MLCC---SMD-SMT_KEMET-KEMET-C0603C473K5RACAUTO_C129629.html
footprint CAP-0603 (0603 (1608M) Capacitor)
pins: 1, 2

## C0603C474K4RACAUTO
designator C?  Capacitance: 470nF  (hidden comment: *)
Capacitor, Ceramic (MLCC), 470nF, ±10%, 16V, X7R, ±10%, SMD 0603; Manufacturer: KEMET; Manufacturer Part Number: C0603C474K4RACAUTO; Package Size: 0603; JLCPCB Basic Part: No; JLCPCB Part Number: C561783; Supplier 1: LCSC; Category: Capacitors - MLCC; Supplier Part Number 1: C561783; Tolerance: ±10%; Voltage Rating: 16V; Temperature Coefficient: X7R; RoHS: Yes; ComponentLink1Description: Datasheet; ComponentLink1URL: https://wmsc.lcsc.com/wmsc/upload/file/pdf/v2/lcsc/2304140030_KEMET-C0603C474K4RACAUTO_C561783.pdf; ComponentLink2Description: JLCPCB Part URL; ComponentLink2URL: https://jlcpcb.com/partdetail/C561783; ComponentLink3Description: LCSC Part URL; ComponentLink3URL: https://lcsc.com/product-detail/Multilayer-Ceramic-Capacitors-MLCC---SMD-SMT_KEMET-KEMET-C0603C474K4RACAUTO_C561783.html
footprint CAP-0603 (0603 (1608M) Capacitor)
pins: 1, 2

## C0603C474K8RAC7867
designator C?  Capacitance: 470nF  (hidden comment: *)
Capacitor, Ceramic (MLCC), 470nF, ±10%, 10V, X7R, ±10%, SMD 0603; Manufacturer: KEMET; Manufacturer Part Number: C0603C474K8RAC7867; Package Size: 0603; JLCPCB Basic Part: No; JLCPCB Part Number: C141108; Supplier 1: LCSC; Category: Capacitors - MLCC; Supplier Part Number 1: C141108; Tolerance: ±10%; Voltage Rating: 10V; Temperature Coefficient: X7R; RoHS: Yes; ComponentLink1Description: Datasheet; ComponentLink1URL: https://wmsc.lcsc.com/wmsc/upload/file/pdf/v2/lcsc/2304140030_KEMET-C0603C474K8RAC7867_C141108.pdf; ComponentLink2Description: JLCPCB Part URL; ComponentLink2URL: https://jlcpcb.com/partdetail/C141108; ComponentLink3Description: LCSC Part URL; ComponentLink3URL: https://lcsc.com/product-detail/Multilayer-Ceramic-Capacitors-MLCC---SMD-SMT_KEMET-KEMET-C0603C474K8RAC7867_C141108.html
footprint CAP-0603 (0603 (1608M) Capacitor)
pins: 1, 2

## C0603C564K4PACTU
designator C?  Capacitance: 560nF  (hidden comment: *)
Capacitor, Ceramic (MLCC), 560nF, ±10%, 16V, X5R, ±10%, SMD 0603; Manufacturer: KEMET; Manufacturer Part Number: C0603C564K4PACTU; Package Size: 0603; JLCPCB Basic Part: No; JLCPCB Part Number: C2232015; Supplier 1: LCSC; Category: Capacitors - MLCC; Supplier Part Number 1: C2232015; Tolerance: ±10%; Voltage Rating: 16V; Temperature Coefficient: X5R; RoHS: Yes; ComponentLink1Description: Datasheet; ComponentLink1URL: https://wmsc.lcsc.com/wmsc/upload/file/pdf/v2/lcsc/2304140030_KEMET-C0603C564K4PACTU_C2232015.pdf; ComponentLink2Description: JLCPCB Part URL; ComponentLink2URL: https://jlcpcb.com/partdetail/C2232015; ComponentLink3Description: LCSC Part URL; ComponentLink3URL: https://lcsc.com/product-detail/Multilayer-Ceramic-Capacitors-MLCC---SMD-SMT_KEMET-KEMET-C0603C564K4PACTU_C2232015.html
footprint CAP-0603 (0603 (1608M) Capacitor)
pins: 1, 2

## C0603C683K5RACAUTO
designator C?  Capacitance: 68nF  (hidden comment: *)
Capacitor, Ceramic (MLCC), 68nF, ±10%, 50V, X7R, ±10%, SMD 0603; Manufacturer: KEMET; Manufacturer Part Number: C0603C683K5RACAUTO; Package Size: 0603; JLCPCB Basic Part: No; JLCPCB Part Number: C561832; Supplier 1: LCSC; Category: Capacitors - MLCC; Supplier Part Number 1: C561832; Tolerance: ±10%; Voltage Rating: 50V; Temperature Coefficient: X7R; RoHS: Yes; ComponentLink1Description: Datasheet; ComponentLink1URL: https://wmsc.lcsc.com/wmsc/upload/file/pdf/v2/lcsc/2304140030_KEMET-C0603C683K5RACAUTO_C561832.pdf; ComponentLink2Description: JLCPCB Part URL; ComponentLink2URL: https://jlcpcb.com/partdetail/C561832; ComponentLink3Description: LCSC Part URL; ComponentLink3URL: https://lcsc.com/product-detail/Multilayer-Ceramic-Capacitors-MLCC---SMD-SMT_KEMET-KEMET-C0603C683K5RACAUTO_C561832.html
footprint CAP-0603 (0603 (1608M) Capacitor)
pins: 1, 2

## C0603COG222J500NT
designator C?  Capacitance: 2.2nF  (hidden comment: *)
Capacitor, Ceramic (MLCC), 2.2nF, 50V, SMD 0603; Manufacturer: SANYEAR; Manufacturer Part Number: C0603COG222J500NT; Package Size: 0603; JLCPCB Basic Part: No; JLCPCB Part Number: C2835509; Supplier 1: LCSC; Category: Capacitors - MLCC; Supplier Part Number 1: C2835509; Voltage Rating: 50V; RoHS: Yes; ComponentLink1Description: Datasheet; ComponentLink1URL: https://wmsc.lcsc.com/wmsc/upload/file/pdf/v2/lcsc/2304140030_SANYEAR-C0603COG222J500NT_C2835509.pdf; ComponentLink2Description: JLCPCB Part URL; ComponentLink2URL: https://jlcpcb.com/partdetail/C2835509; ComponentLink3Description: LCSC Part URL; ComponentLink3URL: https://lcsc.com/product-detail/Multilayer-Ceramic-Capacitors-MLCC---SMD-SMT_SANYEAR-SANYEAR-C0603COG222J500NT_C2835509.html
footprint CAP-0603 (0603 (1608M) Capacitor)
pins: 1, 2

## C0603N2R2J251T
designator C?  Capacitance: 2.2pF  (hidden comment: *)
Capacitor, Ceramic (MLCC), 2.2pF, ±5%, 250V, NP0, ±5%, SMD 0603; Manufacturer: IHHEC(HOLY STONE ENTERPRISE CO., LTD); Manufacturer Part Number: C0603N2R2J251T; Package Size: 0603; JLCPCB Basic Part: No; JLCPCB Part Number: C961507; Supplier 1: LCSC; Category: Capacitors - MLCC; Supplier Part Number 1: C961507; Tolerance: ±5%; Voltage Rating: 250V; Temperature Coefficient: NP0; RoHS: Yes; ComponentLink1Description: Datasheet; ComponentLink1URL: https://wmsc.lcsc.com/wmsc/upload/file/pdf/v2/lcsc/2304140030_IHHEC-HOLY-STONE-ENTERPRISE-CO---LTD-C0603N2R2J251T_C961507.pdf; ComponentLink2Description: JLCPCB Part URL; ComponentLink2URL: https://jlcpcb.com/partdetail/C961507; ComponentLink3Description: LCSC Part URL; ComponentLink3URL: https://lcsc.com/product-detail/Multilayer-Ceramic-Capacitors-MLCC---SMD-SMT_IHHECHOLY-STONE-ENTERPRISE-CO.%2C-LTD-IHHECHOLY-STONE-ENTERPRISE-CO.%2C-LTD-C0603N2R2J251T_C961507.html
footprint CAP-0603 (0603 (1608M) Capacitor)
pins: 1, 2

## C0603N101K251T
designator C?  Capacitance: 100pF  (hidden comment: *)
Capacitor, Ceramic (MLCC), 100pF, ±10%, 250V, ±10%, SMD 0603; Manufacturer: IHHEC(HOLY STONE ENTERPRISE CO., LTD); Manufacturer Part Number: C0603N101K251T; Package Size: 0603; JLCPCB Basic Part: No; JLCPCB Part Number: C961506; Supplier 1: LCSC; Category: Capacitors - MLCC; Supplier Part Number 1: C961506; Tolerance: ±10%; Voltage Rating: 250V; RoHS: Yes; ComponentLink1Description: Datasheet; ComponentLink1URL: https://wmsc.lcsc.com/wmsc/upload/file/pdf/v2/lcsc/2304140030_IHHEC-HOLY-STONE-ENTERPRISE-CO---LTD-C0603N101K251T_C961506.pdf; ComponentLink2Description: JLCPCB Part URL; ComponentLink2URL: https://jlcpcb.com/partdetail/C961506; ComponentLink3Description: LCSC Part URL; ComponentLink3URL: https://lcsc.com/product-detail/Multilayer-Ceramic-Capacitors-MLCC---SMD-SMT_IHHECHOLY-STONE-ENTERPRISE-CO.%2C-LTD-IHHECHOLY-STONE-ENTERPRISE-CO.%2C-LTD-C0603N101K251T_C961506.html
footprint CAP-0603 (0603 (1608M) Capacitor)
pins: 1, 2

## C0603N182J050T
designator C?  Capacitance: 1.8nF  (hidden comment: *)
Capacitor, Ceramic (MLCC), 1.8nF, ±5%, 50V, NP0, ±5%, SMD 0603; Manufacturer: IHHEC(HOLY STONE ENTERPRISE CO., LTD); Manufacturer Part Number: C0603N182J050T; Package Size: 0603; JLCPCB Basic Part: No; JLCPCB Part Number: C105903; Supplier 1: LCSC; Category: Capacitors - MLCC; Supplier Part Number 1: C105903; Tolerance: ±5%; Voltage Rating: 50V; Temperature Coefficient: NP0; RoHS: Yes; ComponentLink1Description: Datasheet; ComponentLink1URL: https://wmsc.lcsc.com/wmsc/upload/file/pdf/v2/lcsc/2304140030_IHHEC-HOLY-STONE-ENTERPRISE-CO---LTD-C0603N182J050T_C105903.pdf; ComponentLink2Description: JLCPCB Part URL; ComponentLink2URL: https://jlcpcb.com/partdetail/C105903; ComponentLink3Description: LCSC Part URL; ComponentLink3URL: https://lcsc.com/product-detail/Multilayer-Ceramic-Capacitors-MLCC---SMD-SMT_IHHECHOLY-STONE-ENTERPRISE-CO.%2C-LTD-IHHECHOLY-STONE-ENTERPRISE-CO.%2C-LTD-C0603N182J050T_C105903.html
footprint CAP-0603 (0603 (1608M) Capacitor)
pins: 1, 2
